# Altium footprint library Mfd3PcbLib.PcbLib: 32 footprints (part 1 of 2)
Each footprint in its own frame and in the unit in brackets; x right, y up, seen from the top. Pads: shape width x height; smd on the part's side, far side on the other; paste and mask are expansions set on the pad; w line width, h text height; cw(c..) or ccw(c..) is an arc to the next point about the centre after c.
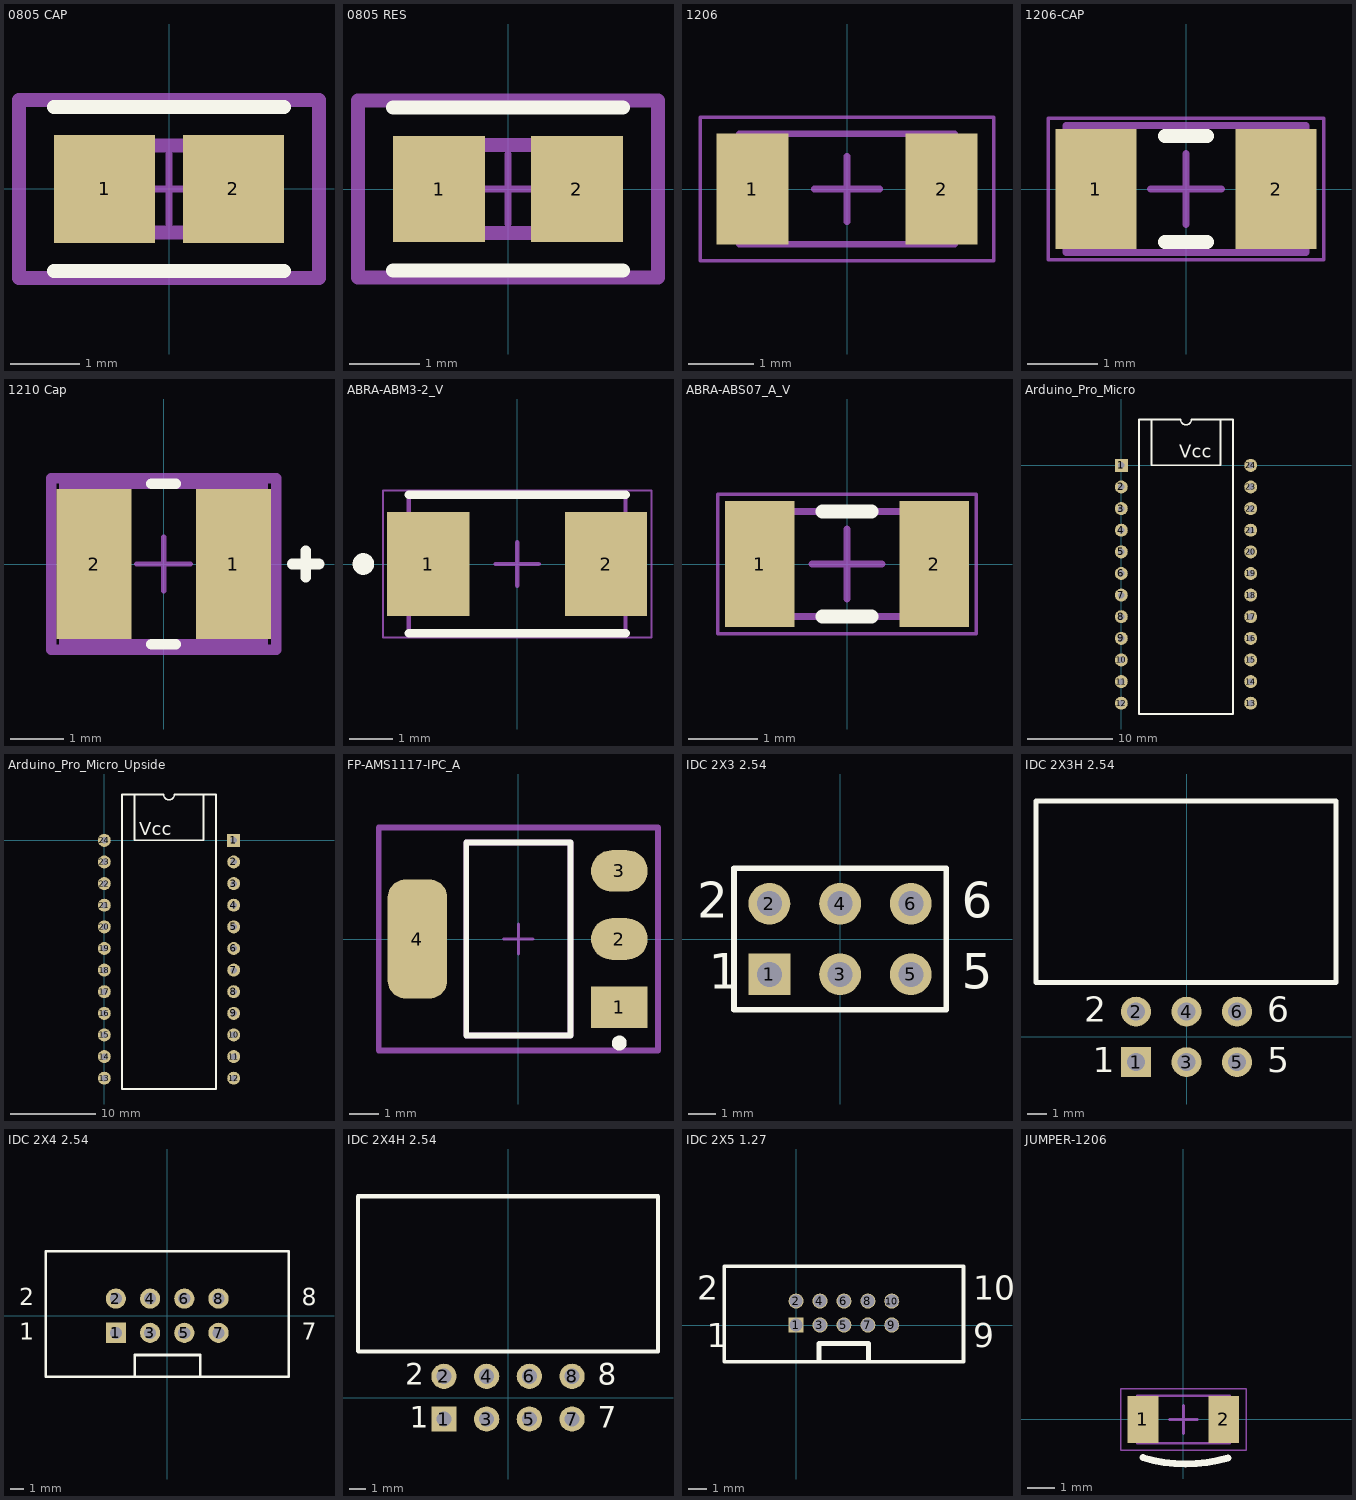
[diagram p0: the footprints below, top view; thin cyan lines are the x and y axes]

## 0805 CAP [mm]
pads (2):
  rect 1.455x1.556 smd paste+0 mask+0: 1(-0.926,0) 2(0.926,0)
Top Overlay:
  lines w0.2: -1.653,-1.178 1.653,-1.178 ; -1.653,1.178 1.653,1.178
Mechanical 5:
  lines w0.2: -2.153,-1.278 2.153,-1.278 2.153,1.278 -2.153,1.278 -2.153,-1.278
  text ".Designator" at 0,0.188 h1
Mechanical 13:
  lines w0.2: -1,-0.625 1,-0.625 1,0.625 -1,0.625 -1,-0.625
Mechanical 15:
  lines w0.2: -2.153,-1.278 2.153,-1.278 2.153,1.278 -2.153,1.278 -2.153,-1.278
Mechanical 16:
  lines w0.1: -0.5,0 0.5,0 ; 0,-0.5 0,0.5
3D body "Cap_Samsung_CL21B273KBANNNC_eec.STEP": height 0.25, standoff 0, extent -2.153,-1.278 2.153,1.278

## 0805 RES [mm]
pads (2):
  rect 1.306x1.508 smd paste+0 mask+0: 1(-0.976,0) 2(0.976,0)
Top Overlay:
  lines w0.2: -1.629,-1.154 1.629,-1.154 ; -1.629,1.154 1.629,1.154
Mechanical 5:
  lines w0.2: -2.129,-1.254 -2.129,1.254 2.129,1.254 2.129,-1.254 -2.129,-1.254
  text ".Designator" at 0,0.188 h1
Mechanical 13:
  lines w0.2: -1,-0.625 -1,0.625 1,0.625 1,-0.625 -1,-0.625
Mechanical 15:
  lines w0.2: -2.129,-1.254 -2.129,1.254 2.129,1.254 2.129,-1.254 -2.129,-1.254
Mechanical 16:
  lines w0.1: -0.5,0 0.5,0 ; 0,-0.5 0,0.5
3D body "Res_TE_Connectivity_RN73C2A2K49B_eec.STEP": height 0.25, standoff 0, extent -2.129,-1.254 2.129,1.254

## 1206 [mm]
pads (2):
  rect 1.1x1.7 smd: 1(-1.45,0) 2(1.45,0)
Mechanical 13:
  lines w0.1: -1.65,-0.85 -1.65,0.85 1.65,0.85 1.65,-0.85 -1.65,-0.85
Mechanical 15:
  lines w0.05: -2.25,-1.1 -2.25,1.1 2.25,1.1 2.25,-1.1 -2.25,-1.1
  lines w0.1: -0.5,0 0.5,0 ; 0,-0.5 0,0.5
3D body: height 0.6, standoff 0, extent -1.2,-0.85 1.2,0.85
3D body: height 0.6, standoff 0, extent -1.65,-0.85 -1.2,0.85
3D body: height 0.6, standoff 0, extent 1.2,-0.85 1.65,0.85

## 1206-CAP [mm] "Chip Capacitor, 2-Leads, Body 3.4x1.8mm, IPC High Density"
height 1.8
pads (2):
  rect 1.15x1.7 smd: 1(-1.275,0) 2(1.275,0)
Top Overlay:
  lines w0.2: -0.3,-0.75 0.3,-0.75 ; -0.3,0.75 0.3,0.75
Mechanical 13:
  lines w0.1: -1.7,-0.9 -1.7,0.9 1.7,0.9 1.7,-0.9 -1.7,-0.9
Mechanical 15:
  lines w0.05: -1.95,-1 -1.95,1 1.95,1 1.95,-1 -1.95,-1
  lines w0.1: -0.5,0 0.5,0 ; 0,-0.5 0,0.5
3D body "CAPC3216X18L.step": height 1.8, standoff 0, extent -1.7,-0.9 1.7,0.9

## 1210 Cap [mm]
pads (2):
  rect 1.4x2.8 smd paste+0 mask+0: 1(1.3,0) 2(-1.3,0)
Top Overlay:
  lines w0.2: -0.225,-1.5 0.225,-1.5 ; -0.225,1.5 0.225,1.5 ; 2.4,0 2.9,0 ; 2.65,-0.25 2.65,0.25
Mechanical 5:
  lines w0.2: -2.1,-1.6 -2.1,1.6 2.1,1.6 2.1,-1.6 -2.1,-1.6
  text ".Designator" at 0,0 h1
Mechanical 13:
  lines w0.2: -1.85,-1.5 -1.85,1.5 1.85,1.5 1.85,-1.5 -1.85,-1.5
Mechanical 15:
  lines w0.2: -2.1,-1.6 -2.1,1.6 2.1,1.6 2.1,-1.6 -2.1,-1.6
Mechanical 16:
  lines w0.1: -0.5,0 0.5,0 ; 0,-0.5 0,0.5
3D body "Cap_AVX_Corporation_TAJB475K010RNJ_eec.STEP": height 0.25, standoff 0, extent -2.1,-1.6 2.1,1.6

## ABRA-ABM3-2_V [mm] "SMD, 2-Leads, Body 5x3.2mm, Pitch 4.1mm"
height 1.3
pads (2):
  rect 1.9x2.4 smd: 1(-2.05,0) 2(2.05,0)
Top Overlay:
  circle w0.25: c-3.55,0 r0.125
  lines w0.2: -2.5,-1.6 2.5,-1.6 ; -2.5,1.6 2.5,1.6
Mechanical 13:
  lines w0.1: -2.5,-1.6 2.5,-1.6 2.5,1.6 -2.5,1.6 -2.5,-1.6
Mechanical 15:
  lines w0.05: -3.1,-1.7 3.1,-1.7 3.1,1.7 -3.1,1.7 -3.1,-1.7
  lines w0.1: -0.5,0 0.5,0 ; 0,-0.5 0,0.5
3D body "ABM3.STEP": height 1.3, standoff 0, extent -2.5,-1.6 2.5,1.6

## ABRA-ABS07_A_V [mm] "SMD, 2-Leads, Body 3.2x1.5mm"
height 0.9
pads (2):
  rect 1x1.8 smd: 1(-1.25,0) 2(1.25,0)
Top Overlay:
  lines w0.2: -0.35,-0.75 0.35,-0.75 ; -0.35,0.75 0.35,0.75
Mechanical 13:
  lines w0.1: -1.6,-0.75 -1.6,0.75 1.6,0.75 1.6,-0.75 -1.6,-0.75
Mechanical 15:
  lines w0.05: -1.85,-1 -1.85,1 1.85,1 1.85,-1 -1.85,-1
  lines w0.1: -0.5,0 0.5,0 ; 0,-0.5 0,0.5
3D body "ABS07.STEP": height 0.9, standoff 0.01, extent -1.6,-0.749 1.6,0.749

## Arduino_Pro_Micro [mil]
pads (24):
  rect 60x60 hole 30: 1(0,0)
  round 60 hole 30: 2(0,-100) 3(0,-200) 4(0,-300) 5(0,-400) 6(0,-500) 7(0,-600) 8(0,-700) 9(0,-800) 10(0,-900) 11(0,-1000) 12(0,-1100) 13(598.43,-1100) 14(598.43,-1000) 15(598.43,-900) 16(598.43,-800) 17(598.43,-700) 18(598.43,-600) 19(598.43,-500) 20(598.43,-400) 21(598.43,-300) 22(598.43,-200) 23(598.43,-100) 24(598.43,0)
Top Overlay:
  lines w7.87: 139.76,212.48 139.76,0 458.66,0 458.66,212.48 ; 82.09,-1150 516.34,-1150 516.34,212.48 324.21,212.48 cw(c299.21,212.48) 274.21,212.48 82.09,212.48 82.09,-1150
  text "." at 3.11,90.71 h60
  text "Vcc" at 266.89,34.61 h60
3D body "ARDUINO PRO MICRO.STEP": height 324.8, standoff -198.82, extent -50,-1150 650,211.81

## Arduino_Pro_Micro_Upside [mil]
pads (24):
  rect 60x60 hole 30: 1(598.43,0)
  round 60 hole 30: 2(598.43,-100) 3(598.43,-200) 4(598.43,-300) 5(598.43,-400) 6(598.43,-500) 7(598.43,-600) 8(598.43,-700) 9(598.43,-800) 10(598.43,-900) 11(598.43,-1000) 12(598.43,-1100) 13(0,-1100) 14(0,-1000) 15(0,-900) 16(0,-800) 17(0,-700) 18(0,-600) 19(0,-500) 20(0,-400) 21(0,-300) 22(0,-200) 23(0,-100) 24(0,0)
Top Overlay:
  lines w7.87: 139.76,212.48 139.76,0 458.66,0 458.66,212.48 ; 82.09,-1150 82.09,212.48 274.21,212.48 ccw(c299.21,212.48) 324.21,212.48 516.34,212.48 516.34,-1150 82.09,-1150
  text "Vcc" at 162.56,22.8 h60
  text "." at 589.72,65.12 h60
3D body "ARDUINO PRO MICRO.STEP": height 533.46, standoff 9.84, extent -51.57,-1150 648.43,211.81

## FP-AMS1117-IPC_A [mm]
pads (4):
  rect 1.9x1.4 smd paste+0 mask+0: 1(3.395,-2.29)
  rrect100% 1.9x1.4 smd paste+0 mask+0: 2(3.395,0) 3(3.395,2.29)
  rrect59% 2x4 smd paste+0 mask+0: 4(-3.395,0)
Top Overlay:
  circle w0.25: c3.395,-3.5 r0.125
  lines w0.2: -1.753,-3.253 -1.753,3.253 1.753,3.253 1.753,-3.253 -1.753,-3.253
Mechanical 5:
  lines w0.2: -4.697,-3.752 -4.697,3.752 4.697,3.752 4.697,-3.752 -4.697,-3.752
  text ".Designator" at 0,-0.188 h1
Mechanical 13:
  lines w0.2: -1.753,-3.253 -1.753,3.253 1.753,3.253 1.753,-3.253 -1.753,-3.253
Mechanical 15:
  lines w0.2: -4.697,-3.752 -4.697,3.752 4.697,3.752 4.697,-3.752 -4.697,-3.752
Mechanical 16:
  lines w0.1: -0.5,0 0.5,0 ; 0,-0.5 0,0.5
3D body "IC_Advanced_Monolithic_Systems_AMS1117-3_3_eec.STEP": height 0.25, standoff 0, extent -4.697,-3.752 4.697,3.752

## IDC 2X3 2.54 [mm] "Connector; Header; 3x2 Position"
pads (6):
  rect 1.5x1.5 hole 0.9: 1(-2.54,-1.27)
  round 1.5 hole 0.9: 2(-2.54,1.27) 3(0,-1.27) 4(0,1.27) 5(2.54,-1.27) 6(2.54,1.27)
Top Overlay:
  lines w0.2: -1.058,-2.54 3.81,-2.54 ; 3.81,-2.54 -3.81,-2.54 -3.81,2.54 3.81,2.54 3.81,-2.54
  text "1" at -4.72,-1.778 h1.27
  text "2" at -5.14,0.762 h1.27
  text "5" at 4.364,-1.778 h1.27
  text "6" at 4.364,0.762 h1.27
3D body "IDC-Header_2x03_P2.54mm_Vertical.step": height 9.1, standoff -3, extent -7.587,-4.411 7.693,4.689

## IDC 2X3H 2.54 [mm] "Connector; Header; 3x2 Position; Right Angle"
pads (6):
  rect 1.5x1.5 hole 0.9: 1(-2.54,-1.27)
  round 1.5 hole 0.9: 2(-2.54,1.27) 3(0,-1.27) 4(0,1.27) 5(2.54,-1.27) 6(2.54,1.27)
Top Overlay:
  lines w0.254: -7.569,2.743 -7.569,11.862 7.518,11.862 7.518,11.836 7.518,2.743 -7.569,2.743
  text "6" at 4.064,0.762 h1.27
  text "5" at 4.064,-1.778 h1.27
  text "1" at -4.72,-1.778 h1.27
  text "2" at -5.14,0.762 h1.27
3D body "IDC-Header_2x03_P2.54mm_Horizontal.step": height 9.1, standoff -3, extent -7.64,-1.62 7.64,11.93

## IDC 2X4 2.54 [mm] "Connector; Header; 4x2 Position"
pads (8):
  rect 1.5x1.5 hole 0.9: 1(-3.81,-1.27)
  round 1.5 hole 0.9: 2(-3.81,1.27) 3(-1.27,-1.27) 4(-1.27,1.27) 5(1.27,-1.27) 6(1.27,1.27) 7(3.81,-1.27) 8(3.81,1.27)
Top Overlay:
  lines w0.2: -2.413,-4.521 -2.413,-2.921 2.464,-2.921 2.464,-4.521 ; -9.017,-4.521 9.017,-4.521 9.017,4.775 -9.017,4.775 -9.017,-4.521
  text "2" at -11,0.762 h1.27
  text "1" at -11,-1.778 h1.27
  text "7" at 10,-1.778 h1.27
  text "8" at 10,0.762 h1.27
3D body "IDC-Header_2x04_P2.54mm_Vertical.step": height 9.1, standoff -3, extent -8.91,-4.425 8.91,4.675

## IDC 2X4H 2.54 [mm] "Connector; Header; 4x2 Position; Right Angle"
pads (8):
  rect 1.5x1.5 hole 0.9: 1(-3.81,-1.27)
  round 1.5 hole 0.9: 2(-3.81,1.27) 3(-1.27,-1.27) 4(-1.27,1.27) 5(1.27,-1.27) 6(1.27,1.27) 7(3.81,-1.27) 8(3.81,1.27)
Top Overlay:
  lines w0.254: -8.915,2.769 -8.915,11.963 8.915,11.963 8.915,2.743 8.89,2.743 -8.89,2.743
  text "2" at -6.096,0.762 h1.27
  text "1" at -5.842,-1.778 h1.27
  text "7" at 5.334,-1.778 h1.27
  text "8" at 5.334,0.762 h1.27
3D body "IDC-Header_2x04_P2.54mm_Horizontal.step": height 9.1, standoff -3, extent -8.91,-1.59 8.91,11.96

## IDC 2X5 1.27 [mm] "Connector; Header; 5x2 Position"
pads (10):
  rect 0.8x0.8 hole 0.7: 1(0,0)
  round 0.8 hole 0.7: 2(0,1.27) 3(1.27,0) 4(1.27,1.27) 5(2.54,0) 6(2.54,1.27) 7(3.81,0) 8(3.81,1.27) 9(5.08,0) 10(5.08,1.27)
Top Overlay:
  lines w0.2: -3.81,-1.956 -3.81,3.124 8.89,3.124 8.89,-1.956 -3.81,-1.956
  lines w0.254: 1.225,-1.925 1.225,-0.975 3.85,-0.975 3.85,-1.925
  text "2" at -5.258,1.346 h1.27
  text "1" at -4.75,-1.194 h1.27
  text "9" at 9.398,-1.194 h1.27
  text "10" at 9.398,1.346 h1.27
3D body "IDC-Header_2x05_P1.27mm_Vertical.STEP": height 5.4, standoff -2.1, extent -3.785,-1.996 8.865,3.134

## JUMPER-1206 [mm]
pads (2):
  rect 1.1x1.7 smd: 1(-1.45,0) 2(1.45,0)
Top Overlay:
  lines w0.254: -1.45,-1.372 ccw(c0.094,3.784) 1.603,-1.382
Mechanical 13:
  lines w0.1: -1.65,-0.85 -1.65,0.85 1.65,0.85 1.65,-0.85 -1.65,-0.85
Mechanical 15:
  lines w0.05: -2.25,-1.1 -2.25,1.1 2.25,1.1 2.25,-1.1 -2.25,-1.1
  lines w0.1: -0.5,0 0.5,0 ; 0,-0.5 0,0.5
3D body: height 0.6, standoff 0, extent -1.2,-0.85 1.2,0.85
3D body: height 0.6, standoff 0, extent -1.65,-0.85 -1.2,0.85
3D body: height 0.6, standoff 0, extent 1.2,-0.85 1.65,0.85